# Altium footprint library SMT.PcbLib: 379 footprints (part 14 of 24)
Each footprint in its own frame and in the unit in brackets; x right, y up, seen from the top. Pads: shape width x height; smd on the part's side, far side on the other; paste and mask are expansions set on the pad; w line width, h text height; cw(c..) or ccw(c..) is an arc to the next point about the centre after c.
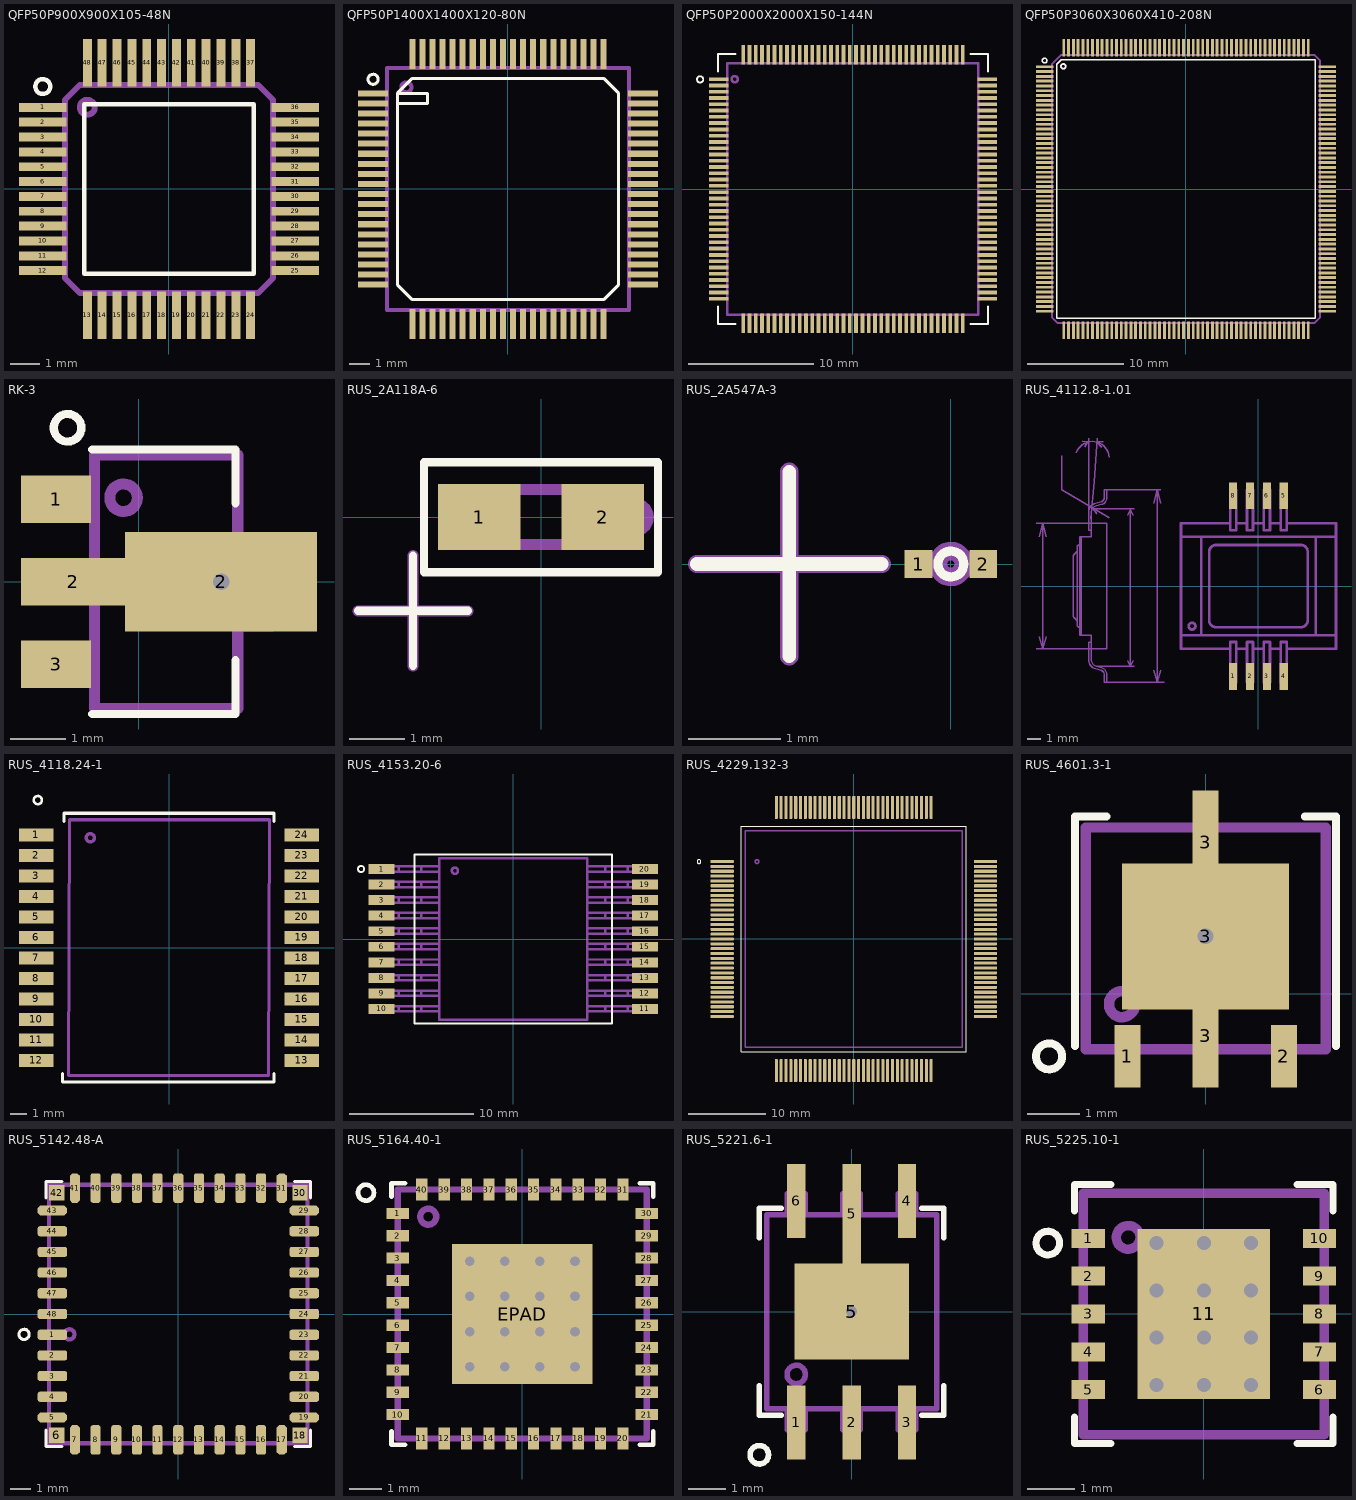
[diagram p13: the footprints below, top view; thin cyan lines are the x and y axes]

## QFP50P900X900X105-48N [mm] "QFP, 48-Leads, Body 9,0x9,0mm (max), Pitch 0,50mm, IPC Medium Density"
height 1.05
pads (48):
  rect 1.6x0.3 smd mask+0.01: 1(-4.25,2.75) 2(-4.25,2.25) 3(-4.25,1.75) 4(-4.25,1.25) 5(-4.25,0.75) 6(-4.25,0.25) 7(-4.25,-0.25) 8(-4.25,-0.75) 9(-4.25,-1.25) 10(-4.25,-1.75) 11(-4.25,-2.25) 12(-4.25,-2.75) 25(4.25,-2.75) 26(4.25,-2.25) 27(4.25,-1.75) 28(4.25,-1.25) 29(4.25,-0.75) 30(4.25,-0.25) 31(4.25,0.25) 32(4.25,0.75) 33(4.25,1.25) 34(4.25,1.75) 35(4.25,2.25) 36(4.25,2.75)
  rect 0.3x1.6 smd mask+0.01: 13(-2.75,-4.25) 14(-2.25,-4.25) 15(-1.75,-4.25) 16(-1.25,-4.25) 17(-0.75,-4.25) 18(-0.25,-4.25) 19(0.25,-4.25) 20(0.75,-4.25) 21(1.25,-4.25) 22(1.75,-4.25) 23(2.25,-4.25) 24(2.75,-4.25) 37(2.75,4.25) 38(2.25,4.25) 39(1.75,4.25) 40(1.25,4.25) 41(0.75,4.25) 42(0.25,4.25) 43(-0.25,4.25) 44(-0.75,4.25) 45(-1.25,4.25) 46(-1.75,4.25) 47(-2.25,4.25) 48(-2.75,4.25)
Top Overlay:
  circle w0.15: c-4.25,3.45 r0.25
  lines w0.15: -2.85,-2.85 -2.85,2.85 2.85,2.85 2.85,-2.85 -2.85,-2.85
Mechanical 1:
  circle w0.2: c-2.75,2.75 r0.25
  lines w0.2: -4.5,-2.75 -3.5,-2.75 ; -4.5,-2.25 -3.5,-2.25 ; -4.5,-1.75 -3.5,-1.75 ; -4.5,-1.25 -3.5,-1.25 ; -4.5,-0.75 -3.5,-0.75 ; -4.5,-0.25 -3.5,-0.25 ; -4.5,0.25 -3.5,0.25 ; -4.5,0.75 -3.5,0.75 ; -4.5,1.25 -3.5,1.25 ; -4.5,1.75 -3.5,1.75 ; -4.5,2.25 -3.5,2.25 ; -4.5,2.75 -3.5,2.75 ; -2.75,-4.5 -2.75,-3.5 ; -2.75,3.5 -2.75,4.5 ; -2.25,-4.5 -2.25,-3.5 ; -2.25,3.5 -2.25,4.5 ; -1.75,-4.5 -1.75,-3.5 ; -1.75,3.5 -1.75,4.5 ; -1.25,-4.5 -1.25,-3.5 ; -1.25,3.5 -1.25,4.5 ; -0.75,-4.5 -0.75,-3.5 ; -0.75,3.5 -0.75,4.5 ; -0.25,-4.5 -0.25,-3.5 ; -0.25,3.5 -0.25,4.5 ; 0.25,-4.5 0.25,-3.5 ; 0.25,3.5 0.25,4.5 ; 0.75,-4.5 0.75,-3.5 ; 0.75,3.5 0.75,4.5 ; 1.25,-4.5 1.25,-3.5 ; 1.25,3.5 1.25,4.5 ; 1.75,-4.5 1.75,-3.5 ; 1.75,3.5 1.75,4.5 ; 2.25,-4.5 2.25,-3.5 ; 2.25,3.5 2.25,4.5 ; 2.75,-4.5 2.75,-3.5 ; 2.75,3.5 2.75,4.5 ; 3.5,-2.75 4.5,-2.75 ; 3.5,-2.25 4.5,-2.25 ; 3.5,-1.75 4.5,-1.75 ; 3.5,-1.25 4.5,-1.25 ; 3.5,-0.75 4.5,-0.75 ; 3.5,-0.25 4.5,-0.25 ; 3.5,0.25 4.5,0.25 ; 3.5,0.75 4.5,0.75 ; 3.5,1.25 4.5,1.25 ; 3.5,1.75 4.5,1.75 ; 3.5,2.25 4.5,2.25 ; 3.5,2.75 4.5,2.75 ; -3.5,-3 -3,-3.5 3,-3.5 3.5,-3 3.5,3 3,3.5 -3,3.5 -3.5,3 -3.5,-3
3D body "User Library-TQFP48.STEP": height 1.1, standoff 0, extent -4.509,-4.509 4.509,4.509

## QFP50P1400X1400X120-80N [mm] "QFP, 80-Leads, Body 14,00x14,00mm, Pitch 0,50mm, IPC Medium Density"
height 1.2
pads (80):
  rect 1.5x0.3 smd mask+0.01: 1(-6.7,4.75) 2(-6.7,4.25) 3(-6.7,3.75) 4(-6.7,3.25) 5(-6.7,2.75) 6(-6.7,2.25) 7(-6.7,1.75) 8(-6.7,1.25) 9(-6.7,0.75) 10(-6.7,0.25) 11(-6.7,-0.25) 12(-6.7,-0.75) 13(-6.7,-1.25) 14(-6.7,-1.75) 15(-6.7,-2.25) 16(-6.7,-2.75) 17(-6.7,-3.25) 18(-6.7,-3.75) 19(-6.7,-4.25) 20(-6.7,-4.75) 41(6.7,-4.75) 42(6.7,-4.25) 43(6.7,-3.75) 44(6.7,-3.25) 45(6.7,-2.75) 46(6.7,-2.25) 47(6.7,-1.75) 48(6.7,-1.25) 49(6.7,-0.75) 50(6.7,-0.25) 51(6.7,0.25) 52(6.7,0.75) 53(6.7,1.25) 54(6.7,1.75) 55(6.7,2.25) 56(6.7,2.75) 57(6.7,3.25) 58(6.7,3.75) 59(6.7,4.25) 60(6.7,4.75)
  rect 0.3x1.5 smd mask+0.01: 21(-4.75,-6.7) 22(-4.25,-6.7) 23(-3.75,-6.7) 24(-3.25,-6.7) 25(-2.75,-6.7) 26(-2.25,-6.7) 27(-1.75,-6.7) 28(-1.25,-6.7) 29(-0.75,-6.7) 30(-0.25,-6.7) 31(0.25,-6.7) 32(0.75,-6.7) 33(1.25,-6.7) 34(1.75,-6.7) 35(2.25,-6.7) 36(2.75,-6.7) 37(3.25,-6.7) 38(3.75,-6.7) 39(4.25,-6.7) 40(4.75,-6.7) 61(4.75,6.7) 62(4.25,6.7) 63(3.75,6.7) 64(3.25,6.7) 65(2.75,6.7) 66(2.25,6.7) 67(1.75,6.7) 68(1.25,6.7) 69(0.75,6.7) 70(0.25,6.7) 71(-0.25,6.7) 72(-0.75,6.7) 73(-1.25,6.7) 74(-1.75,6.7) 75(-2.25,6.7) 76(-2.75,6.7) 77(-3.25,6.7) 78(-3.75,6.7) 79(-4.25,6.7) 80(-4.75,6.7)
Top Overlay:
  circle w0.15: c-6.7,5.45 r0.25
  lines w0.15: -5.5,4.25 -4,4.25 -4,4.75 -5.5,4.75 ; -5.5,4.75 -4.75,5.5 4.75,5.5 5.5,4.75 5.5,-4.75 4.75,-5.5 -4.75,-5.5 -5.5,-4.75 -5.5,4.75
Mechanical 1:
  circle w0.2: c-5.05,5.05 r0.25
  lines w0.2: -6,-6 6,-6 6,6 -6,6 -6,-6
Mechanical 3:
  circle w0.2: c-5.05,5.05 r0.25
  lines w0.2: -6,-6 -6,6 6,6 6,-6 -6,-6
3D body "User Library-TQFP-80.STEP": height 1.06, standoff 0, extent -7,-7 7,7

## QFP50P2000X2000X150-144N [mm] "Package: TQFP,L; body: 20x20x1,6mm"
height 1.6
pads (144):
  rect 1.55x0.3 smd mask+0.01: 1(-10.7,8.75) 2(-10.7,8.25) 3(-10.7,7.75) 4(-10.7,7.25) 5(-10.7,6.75) 6(-10.7,6.25) 7(-10.7,5.75) 8(-10.7,5.25) 9(-10.7,4.75) 10(-10.7,4.25) 11(-10.7,3.75) 12(-10.7,3.25) 13(-10.7,2.75) 14(-10.7,2.25) 15(-10.7,1.75) 16(-10.7,1.25) 17(-10.7,0.75) 18(-10.7,0.25) 19(-10.7,-0.25) 20(-10.7,-0.75) 21(-10.7,-1.25) 22(-10.7,-1.75) 23(-10.7,-2.25) 24(-10.7,-2.75) 25(-10.7,-3.25) 26(-10.7,-3.75) 27(-10.7,-4.25) 28(-10.7,-4.75) 29(-10.7,-5.25) 30(-10.7,-5.75) 31(-10.7,-6.25) 32(-10.7,-6.75) 33(-10.7,-7.25) 34(-10.7,-7.75) 35(-10.7,-8.25) 36(-10.7,-8.75) 73(10.7,-8.75) 74(10.7,-8.25) 75(10.7,-7.75) 76(10.7,-7.25) 77(10.7,-6.75) 78(10.7,-6.25) 79(10.7,-5.75) 80(10.7,-5.25) 81(10.7,-4.75) 82(10.7,-4.25) 83(10.7,-3.75) 84(10.7,-3.25) 85(10.7,-2.75) 86(10.7,-2.25) 87(10.7,-1.75) 88(10.7,-1.25) 89(10.7,-0.75) 90(10.7,-0.25) 91(10.7,0.25) 92(10.7,0.75) 93(10.7,1.25) 94(10.7,1.75) 95(10.7,2.25) 96(10.7,2.75) 97(10.7,3.25) 98(10.7,3.75) 99(10.7,4.25) 100(10.7,4.75) 101(10.7,5.25) 102(10.7,5.75) 103(10.7,6.25) 104(10.7,6.75) 105(10.7,7.25) 106(10.7,7.75) 107(10.7,8.25) 108(10.7,8.75)
  rect 0.3x1.55 smd mask+0.01: 37(-8.75,-10.7) 38(-8.25,-10.7) 39(-7.75,-10.7) 40(-7.25,-10.7) 41(-6.75,-10.7) 42(-6.25,-10.7) 43(-5.75,-10.7) 44(-5.25,-10.7) 45(-4.75,-10.7) 46(-4.25,-10.7) 47(-3.75,-10.7) 48(-3.25,-10.7) 49(-2.75,-10.7) 50(-2.25,-10.7) 51(-1.75,-10.7) 52(-1.25,-10.7) 53(-0.75,-10.7) 54(-0.25,-10.7) 55(0.25,-10.7) 56(0.75,-10.7) 57(1.25,-10.7) 58(1.75,-10.7) 59(2.25,-10.7) 60(2.75,-10.7) 61(3.25,-10.7) 62(3.75,-10.7) 63(4.25,-10.7) 64(4.75,-10.7) 65(5.25,-10.7) 66(5.75,-10.7) 67(6.25,-10.7) 68(6.75,-10.7) 69(7.25,-10.7) 70(7.75,-10.7) 71(8.25,-10.7) 72(8.75,-10.7) 109(8.75,10.7) 110(8.25,10.7) 111(7.75,10.7) 112(7.25,10.7) 113(6.75,10.7) 114(6.25,10.7) 115(5.75,10.7) 116(5.25,10.7) 117(4.75,10.7) 118(4.25,10.7) 119(3.75,10.7) 120(3.25,10.7) 121(2.75,10.7) 122(2.25,10.7) 123(1.75,10.7) 124(1.25,10.7) 125(0.75,10.7) 126(0.25,10.7) 127(-0.25,10.7) 128(-0.75,10.7) 129(-1.25,10.7) 130(-1.75,10.7) 131(-2.25,10.7) 132(-2.75,10.7) 133(-3.25,10.7) 134(-3.75,10.7) 135(-4.25,10.7) 136(-4.75,10.7) 137(-5.25,10.7) 138(-5.75,10.7) 139(-6.25,10.7) 140(-6.75,10.7) 141(-7.25,10.7) 142(-7.75,10.7) 143(-8.25,10.7) 144(-8.75,10.7)
Top Overlay:
  circle w0.15: c-12.178,8.731 r0.25
  lines w0.15: -10.75,-9.375 -10.75,-10.75 -9.375,-10.75 ; -10.75,9.375 -10.75,10.75 -9.375,10.75 ; 9.375,-10.75 10.75,-10.75 10.75,-9.375 ; 9.375,10.75 10.75,10.75 10.75,9.375
Mechanical 1:
  circle w0.2: c-9.428,8.75 r0.25
  lines w0.2: -10,-10 -10,10 10,10 10,-10 -10,-10
3D body "User Library-LQFP144-2.stp": height 1.6, standoff 0, extent -11.075,-11.075 11.075,11.075

## QFP50P3060X3060X410-208N [mm] "QFP, 256-Leads, Body 28x28mm (max), Pitch 0,50mm, IPC Medium Density"
height 4.1
pads (208):
  rect 1.8x0.3 smd mask+0.01: 1(-14.75,12.75) 2(-14.75,12.25) 3(-14.75,11.75) 4(-14.75,11.25) 5(-14.75,10.75) 6(-14.75,10.25) 7(-14.75,9.75) 8(-14.75,9.25) 9(-14.75,8.75) 10(-14.75,8.25) 11(-14.75,7.75) 12(-14.75,7.25) 13(-14.75,6.75) 14(-14.75,6.25) 15(-14.75,5.75) 16(-14.75,5.25) 17(-14.75,4.75) 18(-14.75,4.25) 19(-14.75,3.75) 20(-14.75,3.25) 21(-14.75,2.75) 22(-14.75,2.25) 23(-14.75,1.75) 24(-14.75,1.25) 25(-14.75,0.75) 26(-14.75,0.25) 27(-14.75,-0.25) 28(-14.75,-0.75) 29(-14.75,-1.25) 30(-14.75,-1.75) 31(-14.75,-2.25) 32(-14.75,-2.75) 33(-14.75,-3.25) 34(-14.75,-3.75) 35(-14.75,-4.25) 36(-14.75,-4.75) 37(-14.75,-5.25) 38(-14.75,-5.75) 39(-14.75,-6.25) 40(-14.75,-6.75) 41(-14.75,-7.25) 42(-14.75,-7.75) 43(-14.75,-8.25) 44(-14.75,-8.75) 45(-14.75,-9.25) 46(-14.75,-9.75) 47(-14.75,-10.25) 48(-14.75,-10.75) 49(-14.75,-11.25) 50(-14.75,-11.75) 51(-14.75,-12.25) 52(-14.75,-12.75) 105(14.75,-12.75) 106(14.75,-12.25) 107(14.75,-11.75) 108(14.75,-11.25) 109(14.75,-10.75) 110(14.75,-10.25) 111(14.75,-9.75) 112(14.75,-9.25) 113(14.75,-8.75) 114(14.75,-8.25) 115(14.75,-7.75) 116(14.75,-7.25) 117(14.75,-6.75) 118(14.75,-6.25) 119(14.75,-5.75) 120(14.75,-5.25) 121(14.75,-4.75) 122(14.75,-4.25) 123(14.75,-3.75) 124(14.75,-3.25) 125(14.75,-2.75) 126(14.75,-2.25) 127(14.75,-1.75) 128(14.75,-1.25) 129(14.75,-0.75) 130(14.75,-0.25) 131(14.75,0.25) 132(14.75,0.75) 133(14.75,1.25) 134(14.75,1.75) 135(14.75,2.25) 136(14.75,2.75) 137(14.75,3.25) 138(14.75,3.75) 139(14.75,4.25) 140(14.75,4.75) 141(14.75,5.25) 142(14.75,5.75) 143(14.75,6.25) 144(14.75,6.75) 145(14.75,7.25) 146(14.75,7.75) 147(14.75,8.25) 148(14.75,8.75) 149(14.75,9.25) 150(14.75,9.75) 151(14.75,10.25) 152(14.75,10.75) 153(14.75,11.25) 154(14.75,11.75) 155(14.75,12.25) 156(14.75,12.75)
  rect 0.3x1.8 smd mask+0.01: 53(-12.75,-14.75) 54(-12.25,-14.75) 55(-11.75,-14.75) 56(-11.25,-14.75) 57(-10.75,-14.75) 58(-10.25,-14.75) 59(-9.75,-14.75) 60(-9.25,-14.75) 61(-8.75,-14.75) 62(-8.25,-14.75) 63(-7.75,-14.75) 64(-7.25,-14.75) 65(-6.75,-14.75) 66(-6.25,-14.75) 67(-5.75,-14.75) 68(-5.25,-14.75) 69(-4.75,-14.75) 70(-4.25,-14.75) 71(-3.75,-14.75) 72(-3.25,-14.75) 73(-2.75,-14.75) 74(-2.25,-14.75) 75(-1.75,-14.75) 76(-1.25,-14.75) 77(-0.75,-14.75) 78(-0.25,-14.75) 79(0.25,-14.75) 80(0.75,-14.75) 81(1.25,-14.75) 82(1.75,-14.75) 83(2.25,-14.75) 84(2.75,-14.75) 85(3.25,-14.75) 86(3.75,-14.75) 87(4.25,-14.75) 88(4.75,-14.75) 89(5.25,-14.75) 90(5.75,-14.75) 91(6.25,-14.75) 92(6.75,-14.75) 93(7.25,-14.75) 94(7.75,-14.75) 95(8.25,-14.75) 96(8.75,-14.75) 97(9.25,-14.75) 98(9.75,-14.75) 99(10.25,-14.75) 100(10.75,-14.75) 101(11.25,-14.75) 102(11.75,-14.75) 103(12.25,-14.75) 104(12.75,-14.75) 157(12.75,14.75) 158(12.25,14.75) 159(11.75,14.75) 160(11.25,14.75) 161(10.75,14.75) 162(10.25,14.75) 163(9.75,14.75) 164(9.25,14.75) 165(8.75,14.75) 166(8.25,14.75) 167(7.75,14.75) 168(7.25,14.75) 169(6.75,14.75) 170(6.25,14.75) 171(5.75,14.75) 172(5.25,14.75) 173(4.75,14.75) 174(4.25,14.75) 175(3.75,14.75) 176(3.25,14.75) 177(2.75,14.75) 178(2.25,14.75) 179(1.75,14.75) 180(1.25,14.75) 181(0.75,14.75) 182(0.25,14.75) 183(-0.25,14.75) 184(-0.75,14.75) 185(-1.25,14.75) 186(-1.75,14.75) 187(-2.25,14.75) 188(-2.75,14.75) 189(-3.25,14.75) 190(-3.75,14.75) 191(-4.25,14.75) 192(-4.75,14.75) 193(-5.25,14.75) 194(-5.75,14.75) 195(-6.25,14.75) 196(-6.75,14.75) 197(-7.25,14.75) 198(-7.75,14.75) 199(-8.25,14.75) 200(-8.75,14.75) 201(-9.25,14.75) 202(-9.75,14.75) 203(-10.25,14.75) 204(-10.75,14.75) 205(-11.25,14.75) 206(-11.75,14.75) 207(-12.25,14.75) 208(-12.75,14.75)
Top Overlay:
  circle w0.15: c-12.8,12.8 r0.25
  circle w0.15: c-14.75,13.4 r0.25
  lines w0.15: -13.5,-13.5 -13.5,13 -13,13.5 13.5,13.5 13.5,-13.5 -13.5,-13.5
Mechanical 1:
  drawing of 217 lines, arcs and shapes, not listed
3D body "SW3dPS-PQ208.STEP": height 4.13, standoff -0.11, extent -15.3,-15.35 15.3,15.25

## RK-3 [mm] "SOT89, 3-Leads, Body 4,60x2,60mm, Pitch 1,50mm, Lead Span 3,8mm, IPC Medium Density"
height 1.6
pads (4):
  rect 1.27x0.86 smd: 1(-1.497,1.5) 3(-1.497,-1.5)
  rect 1.89x0.86 smd: 2(-1.187,0)
  rect 3.48x1.8 hole 0.3 paste+0: 2(1.497,0)
Top Overlay:
  circle w0.15: c-1.288,2.794 r0.25
  lines w0.15: -0.84,-2.4 1.76,-2.4 1.76,-1.425 ; -0.84,2.4 1.76,2.4 1.76,1.425
Top Paste:
  rectangle: 1.338,-0.5 2.338,0.5
Mechanical 1:
  circle w0.2: c-0.272,1.524 r0.25
  lines w0.2: -0.877,-1.708 -1.777,-1.708 -1.777,-1.293 -0.877,-1.293 ; -0.877,-0.233 -1.777,-0.233 -1.777,0.232 -0.877,0.232 ; -0.877,1.292 -1.777,1.292 -1.777,1.707 -0.877,1.707 ; 1.823,-0.801 2.423,-0.801 2.423,0.799 1.823,0.799 ; -0.8,-2.3 1.8,-2.3 1.8,2.3 -0.8,2.3 -0.8,-2.3
Mechanical 20:
  text "Необходима прошивка, см. pdf" at -2.184,-5.545 h1.2
3D body "SOT89-150P380X160-3N.step": height 1.6, standoff 0, extent -1.837,-2.296 2.343,2.297

## RUS_2A118A-6 [mm] "Molded Diode, 2-Leads, Body 2.1x1mm, IPC Medium Density"
height 1.1
pads (2):
  rect 1.5x1.2 smd: 1(-1.125,0) 2(1.125,0)
Top Overlay:
  lines w0.15: -3.325,-1.7 -1.325,-1.7 ; -2.325,-2.7 -2.325,-0.7 ; -2.125,-1 -2.125,1 2.125,1 2.125,-1 -2.125,-1
Mechanical 1:
  circle w0.2: c1.7,0 r0.25
  lines w0.2: -3.325,-1.7 -1.325,-1.7 ; -2.325,-2.7 -2.325,-0.7 ; -1.05,-0.5 1.05,-0.5 1.05,0.5 -1.05,0.5 -1.05,-0.5
3D body "Диод.stp": height 1.11, standoff 0.01, extent -1.05,-0.5 1.05,0.5

## RUS_2A547A-3 [mm] "Диод"
height 0.06
pads (2):
  rect 0.3x0.3 smd paste-5 mask+0.05: 1(-0.35,0) 2(0.35,0)
Top Overlay:
  circle w0.1: c0,0 r0.14
  lines w0.15: -2.75,0 -0.75,0 ; -1.75,-1 -1.75,1
Mechanical 1:
  circle w0.2: c0,0 r0.14
  circle w0.1: c0,0 r0.14
  lines w0.15: -0.35,0 -0.127,0 ; 0.14,0 0.35,0
  lines w0.2: -2.75,0 -0.75,0 ; -1.75,-1 -1.75,1
Mechanical 20:
  text "Монтаж производят методом термокомпрессии,  / точечной сварки или пайки мягкими припоями. /  Установку производить металлической иглой или  /  капилляром с принудительным воздушным разряжением." at -5.207,-2.667 h0.5
3D body "2A547A-3.stp": height 0.05, standoff -0.01, extent -0.45,-0.1 0.45,0.1

## RUS_4112.8-1.01 [mm] "Установка показана на слое Mech20"
height 2.9
pads (8):
  rect 0.6x2 smd: 1(-1.875,-6.7) 2(-0.625,-6.7) 3(0.625,-6.7) 4(1.875,-6.7) 5(1.875,6.7) 6(0.625,6.7) 7(-0.625,6.7) 8(-1.875,6.7)
Mechanical 1:
  circle w0.2: c-4.925,-2.975 r0.25
  lines w0.2: -2.1,-4.65 -5.75,-4.65 -5.75,-3.65 ; -2.1,4.65 -5.75,4.65 -5.75,3.65 ; -1.65,-4.65 -0.85,-4.65 ; -1.65,4.65 -0.85,4.65 ; -0.4,-4.65 0.4,-4.65 ; -0.4,4.65 0.4,4.65 ; 0.85,-4.65 1.65,-4.65 ; 0.85,4.65 1.65,4.65 ; 2.1,-4.65 5.75,-4.65 5.75,-3.65 ; 2.1,4.65 5.75,4.65 5.75,3.65 ; -5.75,-3.65 -4.25,-3.65 ; -5.75,-3.65 -5.75,-0.5 -5.75,0.5 -5.75,3.65 ; -5.75,3.65 -4.25,3.65 ; -4.25,-3.65 -4.25,0.5 -4.25,3.65 ; -4.25,-3.65 4.25,-3.65 ; -4.25,3.65 4.25,3.65 ; 4.25,-3.65 4.25,3.65 ; 4.25,-3.65 5.75,-3.65 ; 4.25,3.65 5.75,3.65 ; 5.75,-3.65 5.75,3.65 ; -3.65,-2.55 ccw(c-3.15,-2.55) -3.15,-3.05 3.15,-3.05 ccw(c3.15,-2.55) 3.65,-2.55 3.65,2.55 ccw(c3.15,2.55) 3.15,3.05 -3.15,3.05 ccw(c-3.15,2.55) -3.65,2.55 -3.65,-2.55 ; -2.1,-7.15 -2.1,-6.536 -2.1,-6.246 -2.1,-6.141 -2.1,-5.464 -2.1,-4.15 -1.65,-4.15 -1.65,-5.464 -1.65,-6.141 -1.65,-6.246 -1.65,-6.536 -1.65,-7.15 -2.1,-7.15 ; -2.1,4.15 -1.65,4.15 -1.65,5.464 -1.65,6.141 -1.65,6.246 -1.65,6.536 -1.65,7.15 -2.1,7.15 -2.1,6.536 -2.1,6.246 -2.1,6.141 -2.1,5.464 -2.1,4.15 ; -0.85,-7.15 -0.85,-6.536 -0.85,-6.246 -0.85,-6.141 -0.85,-5.464 -0.85,-4.15 -0.4,-4.15 -0.4,-5.464 -0.4,-6.141 -0.4,-6.246 -0.4,-6.536 -0.4,-7.15 -0.85,-7.15 ; -0.85,4.15 -0.85,5.464 -0.85,6.141 -0.85,6.246 -0.85,6.536 -0.85,7.15 -0.4,7.15 -0.4,6.536 -0.4,6.246 -0.4,6.141 -0.4,5.464 -0.4,4.15 -0.85,4.15 ; 0.4,-7.15 0.85,-7.15 0.85,-6.536 0.85,-6.246 0.85,-6.141 0.85,-5.464 0.85,-4.15 0.4,-4.15 0.4,-5.464 0.4,-6.141 0.4,-6.246 0.4,-6.536 0.4,-7.15 ; 0.4,4.15 0.4,5.464 0.4,6.141 0.4,6.246 0.4,6.536 0.4,7.15 0.85,7.15 0.85,6.536 0.85,6.246 0.85,6.141 0.85,5.464 0.85,4.15 0.4,4.15 ; 1.65,-7.15 2.1,-7.15 2.1,-6.536 2.1,-6.246 2.1,-6.141 2.1,-5.464 2.1,-4.15 1.65,-4.15 1.65,-5.464 1.65,-6.141 1.65,-6.246 1.65,-6.536 1.65,-7.15 ; 1.65,4.15 1.65,5.464 1.65,6.141 1.65,6.246 1.65,6.536 1.65,7.15 2.1,7.15 2.1,6.536 2.1,6.246 2.1,6.141 2.1,5.464 2.1,4.15 1.65,4.15
Mechanical 20:
  lines w0.1: -16.5,-4.65 -12.4,-4.65 ; -16.5,4.65 -12.4,4.65 ; -16.25,-3.75 -16,-4.65 ; -15.75,-3.75 -16,-4.65 ; -15.75,3.65 -16,4.65 ; -14.583,9.65 -14.583,7.15 -11.083,5.05 ; -13.502,9.895 cw(c-12.325,9.475) -11.078,9.556 ; -13.45,-2.633 ccw(c-13.65,-2.633) -13.509,-2.491 -13.691,-2.309 cw(c-13.55,-2.167) -13.75,-2.167 -13.75,-1.75 -13.75,1.75 -13.75,2.167 cw(c-13.55,2.167) -13.691,2.309 -13.509,2.491 ccw(c-13.65,2.633) -13.45,2.633 ; -13.25,-3.05 -13.3,-3.05 cw(c-13.3,-2.9) -13.45,-2.9 -13.45,-2.55 -13.45,2.55 -13.45,2.9 cw(c-13.3,2.9) -13.3,3.05 -13.25,3.05 ; -13.075,10.725 -12.65,10.7 -12.9,10.325 ; -12.6,5 -12.6,10.975 ; -12.429,5.001 -12.189,7.75 -11.975,10.95 ; -12.4,-4.15 -12.6,-4.15 -12.6,-5.464 ccw(c-11.9,-5.464) -12.077,-6.141 -11.674,-6.246 cw(c-11.75,-6.536) -11.45,-6.536 -11.45,-7.15 -11.25,-7.15 ; -12.4,4.15 -12.6,4.15 -12.6,5.464 cw(c-11.9,5.464) -12.077,6.141 -11.674,6.246 ccw(c-11.75,6.536) -11.45,6.536 -11.45,7.15 -11.25,7.15 ; -11.983,5.35 -12.25,5.75 ; -11.808,5.7 -12.25,5.75 ; -11.625,10.3 -11.992,10.7 -11.5,10.7 ; -9.7,-5.548 -9.5,-5.948 ; -9.7,5.25 -9.5,5.65 ; -9.3,-5.548 -9.5,-5.948 ; -9.3,5.25 -9.5,5.65 ; -9.197,-5.948 -12.026,-5.948 ; -9.197,5.75 -12.25,5.75 ; -7.75,-6.25 -7.5,-7.15 ; -7.75,6.141 -7.5,7.15 ; -7.25,-6.25 -7.5,-7.15 ; -7.25,6.141 -7.5,7.15 ; -7.25,7.15 -11.25,7.15 ; -7,-7.15 -11.25,-7.15 ; -16,-4.65 -16,4.65 ; -16,4.65 -16.25,3.65 -16,4.65 ; -13.15,-3.65 -12.4,-3.65 -12.4,-4.65 ; -13.15,-3.65 -13.25,-3.65 -13.25,3.65 -13.15,3.65 ; -13.15,-3.65 -13.15,3.65 ; -13.15,3.65 -12.4,3.65 -12.4,4.65 ; -12.4,-4.65 -12.4,-5.464 ccw(c-11.9,-5.464) -12.026,-5.948 ; -12.4,-4.65 -11.25,-4.65 -11.25,4.65 -12.4,4.65 ; -12.4,4.65 -12.4,5.464 cw(c-11.9,5.464) -12.026,5.948 -11.624,6.052 ccw(c-11.75,6.536) -11.25,6.536 -11.25,7.15 ; -12.026,-5.948 -11.624,-6.052 cw(c-11.75,-6.536) -11.25,-6.536 -11.25,-7.15 ; -9.5,-5.948 -9.5,5.65 ; -7.5,-7.15 -7.5,7.15
  text "9.3*" at -16.75,-1 h1.52
  text "14.5-0.2" at -7.75,-2.25 h1.2
  text "11,6+-0.1" at -10,-2.1 h1.2
  text "R0.3+0.1" at -15.158,6.625 h1.2
  text "4-10" at -12.025,11.225 h1.2
3D body "User Library-4112_8-1_01.STEP": height 2.5, standoff 0, extent -5.75,-7.15 5.75,7.15

## RUS_4118.24-1 [mm] "Установка по ГОСТ 29137 вариант 380.11.1104.25"
height 3.9
pads (24):
  rect 2.1x0.8 smd: 1(-8.1,6.875) 2(-8.1,5.625) 3(-8.1,4.375) 4(-8.1,3.125) 5(-8.1,1.875) 6(-8.1,0.625) 7(-8.1,-0.625) 8(-8.1,-1.875) 9(-8.1,-3.125) 10(-8.1,-4.375) 11(-8.1,-5.625) 12(-8.1,-6.875) 13(8.1,-6.875) 14(8.1,-5.625) 15(8.1,-4.375) 16(8.1,-3.125) 17(8.1,-1.875) 18(8.1,-0.625) 19(8.1,0.625) 20(8.1,1.875) 21(8.1,3.125) 22(8.1,4.375) 23(8.1,5.625) 24(8.1,6.875)
Top Overlay:
  circle w0.15: c-8,9 r0.25
  lines w0.2: -6.5,-7.7 -6.5,-8.2 6.4,-8.2 6.4,-7.7 ; -6.4,7.7 -6.4,8.2 6.4,8.2 6.4,7.7
Mechanical 1:
  circle w0.2: c-4.8,6.7 r0.25
  lines w0.2: -6.125,-7.8 6.075,-7.8 6.125,7.8 -6.075,7.8 -6.125,-7.8
Mechanical 20:
  text "Установка по ГОСТ 29137 вариант 380.11.1104.25" at -12.1,-10.623 h1.5
3D body "4118.24-1.stp": height 3.96, standoff 0.11, extent -9,-7.71 9,7.7

## RUS_4153.20-6 [mm] "Установка по ГОСТ 29137 вариант 360.18.1106.16.00"
height 3.3
pads (20):
  rect 2.1x0.8 smd: 1(-10.6,5.625) 2(-10.6,4.375) 3(-10.6,3.125) 4(-10.6,1.875) 5(-10.6,0.625) 6(-10.6,-0.625) 7(-10.6,-1.875) 8(-10.6,-3.125) 9(-10.6,-4.375) 10(-10.6,-5.625) 11(10.6,-5.625) 12(10.6,-4.375) 13(10.6,-3.125) 14(10.6,-1.875) 15(10.6,-0.625) 16(10.6,0.625) 17(10.6,1.875) 18(10.6,3.125) 19(10.6,4.375) 20(10.6,5.625)
Top Overlay:
  circle w0.15: c-12.25,5.635 r0.25
  lines w0.15: -7.95,-6.8 7.95,-6.8 7.95,6.8 -7.95,6.8 -7.95,-6.8
Mechanical 1:
  drawing of 265 lines, arcs and shapes, not listed
Mechanical 20:
  text "Установка по ГОСТ 29137 вариант 360.18.1106.16.00" at -13.4,-8.2 h1.2
3D body "4153.20-6.stp": height 3.01, standoff 0.01, extent -11.5,-6.5 11.5,6.5

## RUS_4229.132-3 [mm] "SQFP, 132-Leads, Body 28,00x28,00mm, Pitch 0,63mm, IPC Medium Density"
height 3.8
pads (132):
  rrect50% 3x0.4 smd mask+0.05: 1(-17,10) 2(-17,9.375) 3(-17,8.75) 4(-17,8.125) 5(-17,7.5) 6(-17,6.875) 7(-17,6.25) 8(-17,5.625) 9(-17,5) 10(-17,4.375) 11(-17,3.75) 12(-17,3.125) 13(-17,2.5) 14(-17,1.875) 15(-17,1.25) 16(-17,0.625) 17(-17,0) 18(-17,-0.625) 19(-17,-1.25) 20(-17,-1.875) 21(-17,-2.5) 22(-17,-3.125) 23(-17,-3.75) 24(-17,-4.375) 25(-17,-5) 26(-17,-5.625) 27(-17,-6.25) 28(-17,-6.875) 29(-17,-7.5) 30(-17,-8.125) 31(-17,-8.75) 32(-17,-9.375) 33(-17,-10) 67(17,-10) 68(17,-9.375) 69(17,-8.75) 70(17,-8.125) 71(17,-7.5) 72(17,-6.875) 73(17,-6.25) 74(17,-5.625) 75(17,-5) 76(17,-4.375) 77(17,-3.75) 78(17,-3.125) 79(17,-2.5) 80(17,-1.875) 81(17,-1.25) 82(17,-0.625) 83(17,0) 84(17,0.625) 85(17,1.25) 86(17,1.875) 87(17,2.5) 88(17,3.125) 89(17,3.75) 90(17,4.375) 91(17,5) 92(17,5.625) 93(17,6.25) 94(17,6.875) 95(17,7.5) 96(17,8.125) 97(17,8.75) 98(17,9.375) 99(17,10)
  rrect50% 0.4x3 smd mask+0.05: 34(-10,-17) 35(-9.375,-17) 36(-8.75,-17) 37(-8.125,-17) 38(-7.5,-17) 39(-6.875,-17) 40(-6.25,-17) 41(-5.625,-17) 42(-5,-17) 43(-4.375,-17) 44(-3.75,-17) 45(-3.125,-17) 46(-2.5,-17) 47(-1.875,-17) 48(-1.25,-17) 49(-0.625,-17) 50(0,-17) 51(0.625,-17) 52(1.25,-17) 53(1.875,-17) 54(2.5,-17) 55(3.125,-17) 56(3.75,-17) 57(4.375,-17) 58(5,-17) 59(5.625,-17) 60(6.25,-17) 61(6.875,-17) 62(7.5,-17) 63(8.125,-17) 64(8.75,-17) 65(9.375,-17) 66(10,-17) 100(10,17) 101(9.375,17) 102(8.75,17) 103(8.125,17) 104(7.5,17) 105(6.875,17) 106(6.25,17) 107(5.625,17) 108(5,17) 109(4.375,17) 110(3.75,17) 111(3.125,17) 112(2.5,17) 113(1.875,17) 114(1.25,17) 115(0.625,17) 116(0,17) 117(-0.625,17) 118(-1.25,17) 119(-1.875,17) 120(-2.5,17) 121(-3.125,17) 122(-3.75,17) 123(-4.375,17) 124(-5,17) 125(-5.625,17) 126(-6.25,17) 127(-6.875,17) 128(-7.5,17) 129(-8.125,17) 130(-8.75,17) 131(-9.375,17) 132(-10,17)
Top Overlay:
  circle w0.15: c-20,10 r0.25
  lines w0.15: -14.55,-14.55 -14.55,14.55 14.55,14.55 14.55,-14.55 -14.55,-14.55
Mechanical 1:
  circle w0.2: c-12.5,10 r0.25
  lines w0.2: -14,-14 -14,14 14,14 14,-14 -14,-14
Mechanical 20:
  text "Для микросхем с неформованными выводами формовка и установка по ГОСТ 29137-91  / 360.18.1112" at -7,2.8 h1.5
3D body "Корпус 4229.132-3.stp": height 4.5, standoff 0, extent -17,-17 17,17

## RUS_4601.3-1 [mm] "SOT89, 3-Leads, Body 4,60x4.25mm, Pitch 1,50mm,  IPC Medium Density"
height 1.7
pads (5):
  rect 0.5x1.2 smd paste-0.05 mask+0.05: 1(-1.5,-1.2) 2(1.5,-1.2)
  rect 0.5x2 smd paste-5 mask+0.05: 3(0,-0.8) 3(0,2.9)
  rect 3.2x2.8 hole 0.3 mask+0.05: 3(0,1.1)
Top Overlay:
  circle w0.15: c-3,-1.2 r0.25
  lines w0.15: -2.5,-1 -2.5,3.4 -1.9,3.4 ; 1.9,3.4 2.5,3.4 2.5,-1
Top Paste:
  region: -0.2,-0.65 0.2,-0.65 0.2,-1.75 -0.2,-1.75
  region: -0.2,3.85 0.2,3.85 0.2,2.75 -0.2,2.75
  region: -1.5,0.95 -0.15,0.95 -0.15,-0.2 -1.5,-0.2
  region: 0.15,0.95 1.5,0.95 1.5,-0.2 0.15,-0.2
  region: -1.5,2.4 -0.15,2.4 -0.15,1.25 -1.5,1.25
  region: 0.15,2.4 1.5,2.4 1.5,1.25 0.15,1.25
Mechanical 1:
  circle w0.2: c-1.6,-0.2 r0.25
  lines w0.15: -1.498,-1.563 -1.498,-1.063 ; 0,-1.563 0,-1.063 ; 0,3.187 0,3.687 ; 1.521,-1.563 1.521,-1.063
  lines w0.2: -2.3,-1.063 2.3,-1.063 2.3,3.187 -2.3,3.187 -2.3,-1.063
3D body "U Library-4601_3.step": height 1.7, standoff 0, extent -2.3,-1.563 2.3,3.688

## RUS_5142.48-A [mm] "QFN, 48-Leads, Body 12,70x12,70mm, Pitch 1,016mm, IPC Medium Density"
height 2.5
pads (48):
  rrect50% 1.45x0.5 smd paste+0 mask+0.05: 1(-6.185,-1.016) 2(-6.185,-2.032) 3(-6.185,-3.048) 4(-6.185,-4.064) 20(6.185,-4.064) 21(6.185,-3.048) 22(6.185,-2.032) 23(6.185,-1.016) 24(6.185,0) 25(6.185,1.016) 26(6.185,2.032) 27(6.185,3.048) 28(6.185,4.064) 44(-6.185,4.064) 45(-6.185,3.048) 46(-6.185,2.032) 47(-6.185,1.016) 48(-6.185,0)
  oct 1.45x0.5 smd paste+0 mask+0.05: 5(-6.185,-5.08) 19(6.185,-5.08) 29(6.185,5.08) 43(-6.185,5.08)
  rect 0.75x0.75 smd paste+0 mask+0.05: 6(-5.975,-5.95) 18(5.975,-5.95) 30(5.975,5.95) 42(-5.975,5.95)
  oct 0.5x1.45 smd paste+0 mask+0.05: 7(-5.08,-6.185) 17(5.08,-6.185) 31(5.08,6.185) 41(-5.08,6.185)
  rrect50% 0.5x1.45 smd paste+0 mask+0.05: 8(-4.064,-6.185) 9(-3.048,-6.185) 10(-2.032,-6.185) 11(-1.016,-6.185) 12(0,-6.185) 13(1.016,-6.185) 14(2.032,-6.185) 15(3.048,-6.185) 16(4.064,-6.185) 32(4.064,6.185) 33(3.048,6.185) 34(2.032,6.185) 35(1.016,6.185) 36(0,6.185) 37(-1.016,6.185) 38(-2.032,6.185) 39(-3.048,6.185) 40(-4.064,6.185)
Top Overlay:
  circle w0.15: c-7.575,-1 r0.25
  lines w0.15: -6.5,-5.705 -6.5,-6.5 -5.705,-6.5 ; -6.5,5.705 -6.5,6.5 -5.705,6.5 ; 5.705,-6.5 6.5,-6.5 6.5,-5.705 ; 5.705,6.5 6.5,6.5 6.5,5.705
Mechanical 1:
  circle w0.2: c-5.35,-1 r0.25
  lines w0.2: -6.35,-6.35 6.35,-6.35 6.35,6.35 -6.35,6.35 -6.35,-6.35
3D body "QFN102P1270X1270X250-44N.step": height 2.5, standoff 0, extent -6.351,-6.351 6.351,6.351

## RUS_5164.40-1 [mm] "QFN, 40-Leads, Body 7,80x7,80mm, Pitch 0,70mm, Thermal Pad 4,40x4,40mm, IPC Medium Density"
height 2
pads (41):
  rect 0.7x0.35 smd mask+0.05: 1(-3.9,3.15) 2(-3.9,2.45) 3(-3.9,1.75) 4(-3.9,1.05) 5(-3.9,0.35) 6(-3.9,-0.35) 7(-3.9,-1.05) 8(-3.9,-1.75) 9(-3.9,-2.45) 10(-3.9,-3.15) 21(3.9,-3.15) 22(3.9,-2.45) 23(3.9,-1.75) 24(3.9,-1.05) 25(3.9,-0.35) 26(3.9,0.35) 27(3.9,1.05) 28(3.9,1.75) 29(3.9,2.45) 30(3.9,3.15)
  rect 0.35x0.7 smd mask+0.05: 11(-3.15,-3.9) 12(-2.45,-3.9) 13(-1.75,-3.9) 14(-1.05,-3.9) 15(-0.35,-3.9) 16(0.35,-3.9) 17(1.05,-3.9) 18(1.75,-3.9) 19(2.45,-3.9) 20(3.15,-3.9) 31(3.15,3.9) 32(2.45,3.9) 33(1.75,3.9) 34(1.05,3.9) 35(0.35,3.9) 36(-0.35,3.9) 37(-1.05,3.9) 38(-1.75,3.9) 39(-2.45,3.9) 40(-3.15,3.9)
  rect 4.4x4.4 smd paste-5: EPAD(0,0)
via -1.65,1.65 diameter 0.7 hole 0.3
via -0.55,1.65 diameter 0.7 hole 0.3
via 0.55,1.65 diameter 0.7 hole 0.3
via 1.65,1.65 diameter 0.7 hole 0.3
via -1.65,0.55 diameter 0.7 hole 0.3
via -0.55,0.55 diameter 0.7 hole 0.3
via 0.55,0.55 diameter 0.7 hole 0.3
via 1.65,0.55 diameter 0.7 hole 0.3
via -1.65,-0.55 diameter 0.7 hole 0.3
via -0.55,-0.55 diameter 0.7 hole 0.3
via 0.55,-0.55 diameter 0.7 hole 0.3
via 1.65,-0.55 diameter 0.7 hole 0.3
via -1.65,-1.65 diameter 0.7 hole 0.3
via -0.55,-1.65 diameter 0.7 hole 0.3
via 0.55,-1.65 diameter 0.7 hole 0.3
via 1.65,-1.65 diameter 0.7 hole 0.3
Top Overlay:
  circle w0.15: c-4.9,3.8 r0.25
  lines w0.15: -4.1,-3.675 -4.1,-4.1 -3.675,-4.1 ; -4.1,3.675 -4.1,4.1 -3.675,4.1 ; 3.675,-4.1 4.1,-4.1 4.1,-3.675 ; 3.675,4.1 4.1,4.1 4.1,3.675
Top Paste:
  region: 2.2,-2.2 0.2,-2.2 0.2,-0.2 2.2,-0.2
  region: 2.2,2.2 2.2,0.2 0.2,0.2 0.2,2.2
  region: -2.2,-2.2 -2.2,-0.2 -0.2,-0.2 -0.2,-2.2
  region: -2.2,2.2 -0.2,2.2 -0.2,0.2 -2.2,0.2
Mechanical 1:
  circle w0.2: c-2.95,3.05 r0.25
  lines w0.2: -3.9,-3.9 -3.9,3.9 3.9,3.9 3.9,-3.9 -3.9,-3.9
3D body "5164.40-1.stp": height 2, standoff -0.01, extent -3.9,-3.9 3.9,3.9

## RUS_5221.6-1 [mm]
height 1.7
pads (7):
  rect 0.5x2 smd mask+0.05: 1(-1.5,-3) 2(0,-3) 3(1.5,-3) 4(1.5,3) 6(-1.5,3)
  rect 3.1x2.6 hole 0.3 mask+0.05: 5(0,0)
  rect 0.5x2.7 smd mask+0.05: 5(0,2.65)
Top Overlay:
  circle w0.15: c-2.5,-3.875 r0.25
  lines w0.15: -2.5,-2 -2.5,-2.8 -1.9,-2.8 ; -2.5,2 -2.5,2.8 -1.9,2.8 ; 1.9,-2.8 2.5,-2.8 2.5,-2 ; 1.9,2.8 2.5,2.8 2.5,2
Top Paste:
  rectangle: -1,-0.75 1,0.75
Mechanical 1:
  circle w0.15: c-1.5,-1.7 r0.25
  lines w0.15: -1.74,-2.7 -1.74,-3.2 -1.26,-3.2 -1.26,-2.7 ; -1.74,2.7 -1.74,3.2 -1.26,3.2 -1.26,2.7 ; -0.24,-2.7 -0.24,-3.2 0.24,-3.2 0.24,-2.7 ; -0.24,2.7 -0.24,3.2 0.24,3.2 0.24,2.7 ; 1.26,-2.7 1.26,-3.2 1.74,-3.2 1.74,-2.7 ; 1.26,2.7 1.26,3.2 1.74,3.2 1.74,2.7 ; -2.3,-2.625 2.3,-2.625 2.3,2.625 -2.3,2.625 -2.3,-2.625
3D body "rus_5221_6-1.stp": height 1.8, standoff 0, extent -2.3,-3.125 2.3,3.15

## RUS_5225.10-1 [mm] "PSON, 10-Leads, Body 5,10x5,10mm, Pitch 0,80mm, Thermal Pad 3,60x2,80mm, IPC Medium Density"
height 1.1
pads (11):
  rect 0.7x0.4 smd mask+0.05: 1(-2.445,1.6) 2(-2.445,0.8) 3(-2.445,0) 4(-2.445,-0.8) 5(-2.445,-1.6) 6(2.445,-1.6) 7(2.445,-0.8) 8(2.445,0) 9(2.445,0.8) 10(2.445,1.6)
  rect 2.8x3.6 all layers, no hole paste-1.4 mask+0.05: 11(0,0)
via -1,1.5 diameter 0.6 hole 0.3
via 0,1.5 diameter 0.6 hole 0.3
via 1,1.5 diameter 0.6 hole 0.3
via -1,0.5 diameter 0.6 hole 0.3
via 0,0.5 diameter 0.6 hole 0.3
via 1,0.5 diameter 0.6 hole 0.3
via -1,-0.5 diameter 0.6 hole 0.3
via 0,-0.5 diameter 0.6 hole 0.3
via 1,-0.5 diameter 0.6 hole 0.3
via -1,-1.5 diameter 0.6 hole 0.3
via 0,-1.5 diameter 0.6 hole 0.3
via 1,-1.5 diameter 0.6 hole 0.3
Top Overlay:
  circle w0.15: c-3.3,1.5 r0.25
  lines w0.15: -2.735,-2.175 -2.735,-2.735 -1.97,-2.735 ; -2.735,2.175 -2.735,2.735 -1.97,2.735 ; 1.97,-2.735 2.735,-2.735 2.735,-2.175 ; 1.97,2.735 2.735,2.735 2.735,2.175
Top Paste:
  rectangle: -1.35,0.8 -0.15,1.8
  rectangle: -1.35,-0.5 -0.15,0.5
  rectangle: -1.35,-1.8 -0.15,-0.8
  rectangle: 0.15,0.8 1.35,1.8
  rectangle: 0.15,-0.5 1.35,0.5
  rectangle: 0.15,-1.8 1.35,-0.8
Mechanical 1:
  circle w0.2: c-1.6,1.62 r0.25
  lines w0.2: -2.55,-2.55 -2.55,2.55 2.55,2.55 2.55,-2.55 -2.55,-2.55
3D body "PSON80P510X110_HS-11N.step": height 1.1, standoff 0, extent -2.561,-2.56 2.561,2.56